# Altium footprint library BASIC.PcbLib: 244 footprints (part 16 of 16)
Each footprint in its own frame and in the unit in brackets; x right, y up, seen from the top. Pads: shape width x height; smd on the part's side, far side on the other; paste and mask are expansions set on the pad; w line width, h text height; cw(c..) or ccw(c..) is an arc to the next point about the centre after c.
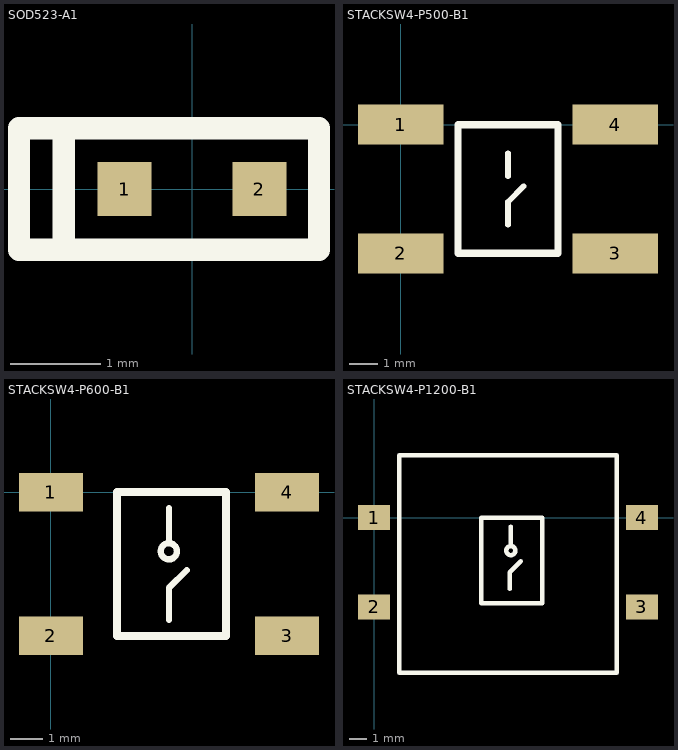
[diagram p15: the footprints below, top view; thin cyan lines are the x and y axes]

## SOD523-A1 [mm]
height 0.7
pads (2):
  rect 0.6x0.6 smd: 1(-0.75,0) 2(0.75,0)
Top Overlay:
  lines w0.25: -1.425,-0.675 -1.425,0.675 ; -1.925,-0.675 1.413,-0.675 1.413,0.675 -1.925,0.675 -1.925,-0.675
3D body "SOD-523.STEP": height 0.7, standoff 0, extent -0.8,-0.399 0.8,0.399

## STACKSW4-P500-B1 [mm]
pads (4):
  rect 3x1.4 smd: 1(0,0) 2(0,-4.5) 3(7.5,-4.5) 4(7.5,0)
Top Overlay:
  lines w0.2: 3.75,-3.5 3.75,-2.7 4.3,-2.15 ; 3.75,-1.8 3.75,-1
  lines w0.25: 2,-4.5 5.5,-4.5 5.5,0 2,0 2,-4.5

## STACKSW4-P600-B1 [mm]
height 4.3
pads (4):
  rect 2x1.2 smd: 1(0,0) 2(0,-4.5) 3(7.4,-4.5) 4(7.4,0)
Top Overlay:
  circle w0.2: c3.695,-1.85 r0.255
  lines w0.2: 3.7,-4 3.7,-3 ; 3.7,-1.5 3.7,-0.5 ; 3.701,-2.998 4.251,-2.448
  lines w0.25: 2.069,-4.5 2.069,0 5.49,0 5.49,-4.5 2.069,-4.5
3D body "User Library-TS-1143S-WP.STEP": height 4.3, standoff 0, extent -0.325,-5.525 7.675,0.975

## STACKSW4-P1200-B1 [mm]
height 8
pads (4):
  rect 1.8x1.4 smd: 1(0,0) 2(0,-5) 3(15,-5) 4(15,0)
Top Overlay:
  circle w0.25: c7.657,-1.85 r0.255
  lines w0.25: 7.596,-4 7.596,-3.065 8.213,-2.448 ; 7.662,-1.5 7.662,-0.5 ; 1.4,-8.7 1.4,3.5 13.6,3.5 13.6,-8.7 1.4,-8.7 ; 5.994,-4.801 5.994,0 9.423,0 9.423,-4.801 5.994,-4.801
3D body "User Library-SWT_12x12_SMD.STEP": height 4, standoff 0, extent 0.766,-8.612 14.216,3.388